# Altium footprint library TriggersLib.PcbLib: 262 footprints (part 2 of 17)
Each footprint in its own frame and in the unit in brackets; x right, y up, seen from the top. Pads: shape width x height; smd on the part's side, far side on the other; paste and mask are expansions set on the pad; w line width, h text height; cw(c..) or ccw(c..) is an arc to the next point about the centre after c.
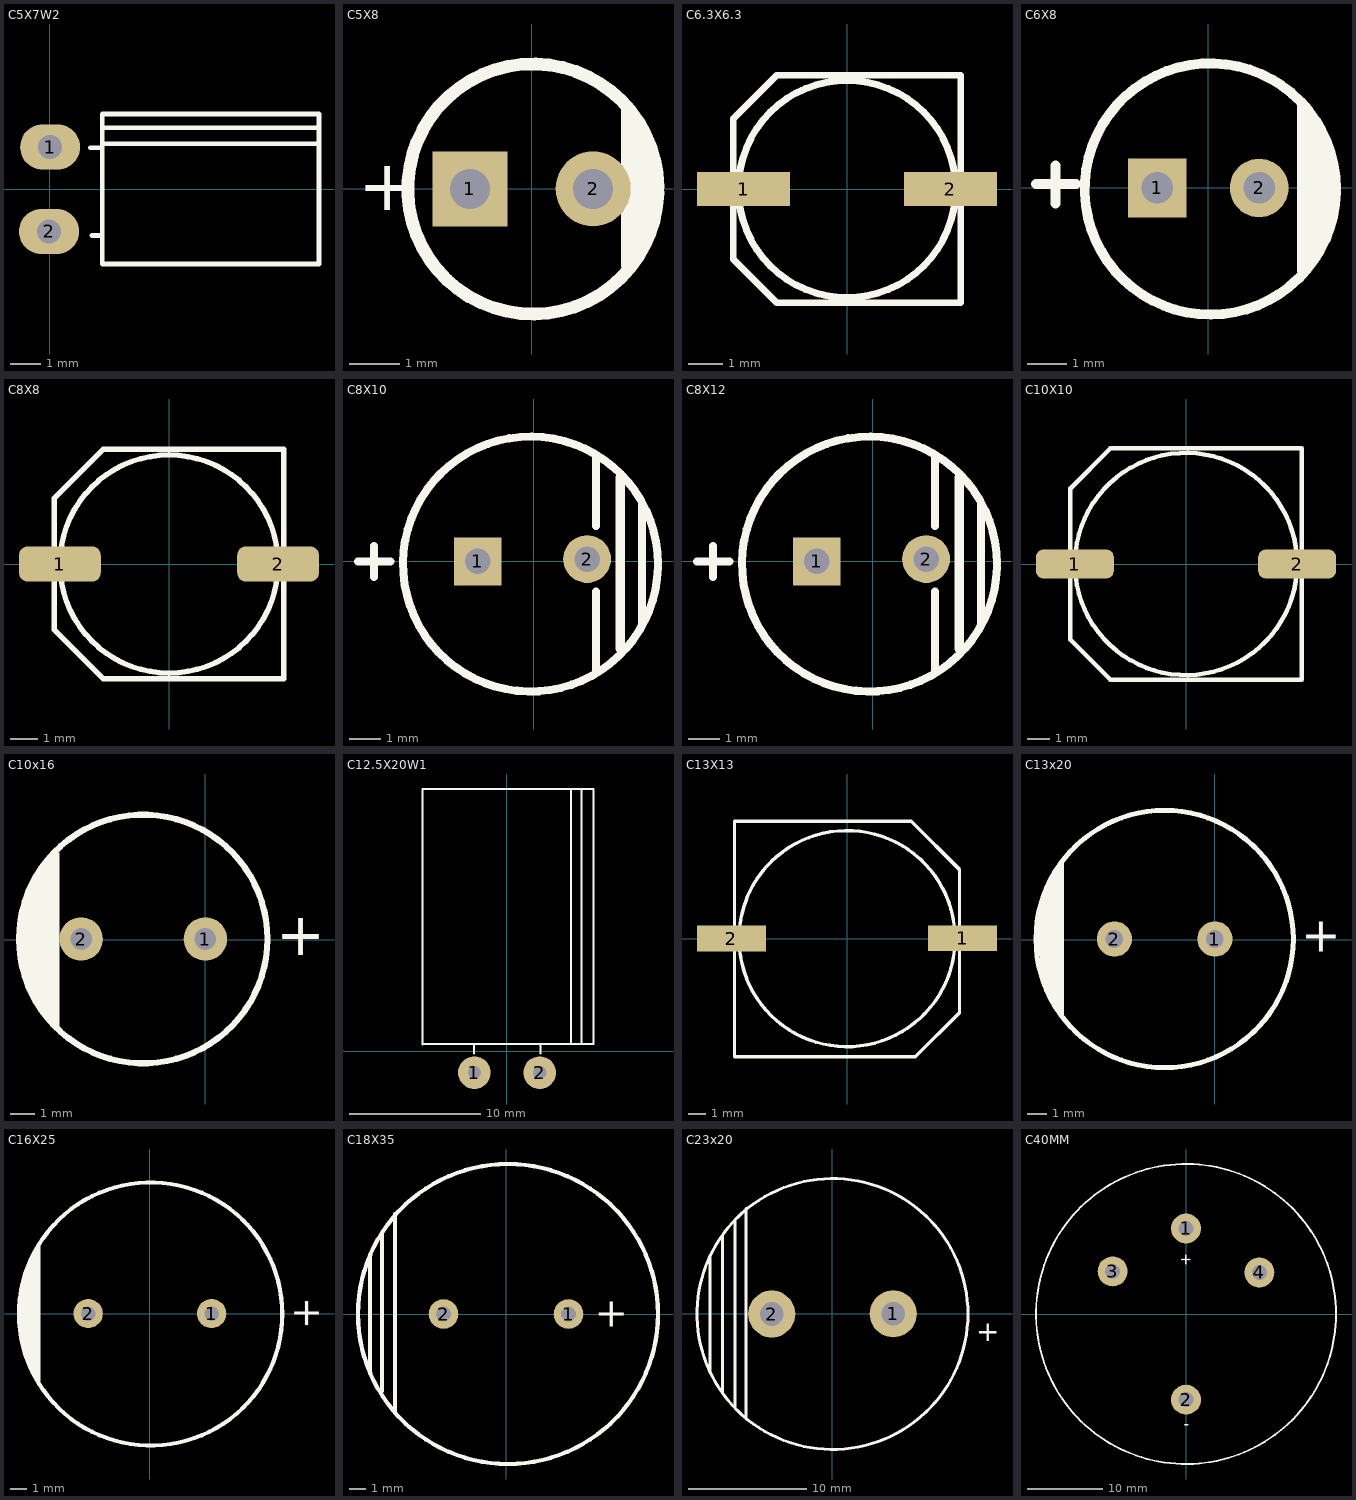
[diagram p1: the footprints below, top view; thin cyan lines are the x and y axes]

## C5X7W2 [mm]
pads (2):
  oval 2x1.5 hole 0.8: 1(0.018,1.404) 2(-0.018,-1.404)
Top Overlay:
  lines w0.152: 1.356,1.385 1.69,1.385 ; 1.406,-1.537 1.729,-1.537 ; 1.776,1.514 8.955,1.514 ; 1.83,2.048 8.955,2.048 ; 1.756,-2.483 8.956,-2.483 8.956,2.501 1.756,2.501 1.756,-2.483
3D body "User Library-Cap electro 5x7x2mm RA_.STEP": height 5.13, standoff 0.07, extent 1.652,-2.519 8.927,2.531
3D body "3HW1L1.STEP": height 2.7, standoff -1.5, extent -0.376,-1.785 2.305,-0.93
3D body "3HW1L1.STEP": height 2.7, standoff -1.5, extent -0.345,0.704 2.321,1.777

## C5X8 [mm] "RB.1/.2"
pads (2):
  rect 1.5x1.5 hole 0.8: 1(-1.231,0)
  round 1.5 hole 0.8: 2(1.231,0)
Top Overlay:
  lines w0.254: 2.526,-0.076 cw(c0.028,-0.004) 2.527,0.037
  lines w0.3: 1.942,-1.524 1.942,1.549
  lines w0.5: 2.196,-0.94 2.196,0.94
  text "+" at -3.468,-0.432 h1.02
3D body "C5x8.STEP": height 8.13, standoff -2.37, extent -2.499,-2.503 2.501,2.489

## C6.3X6.3 [mm]
height 5.5
pads (2):
  rect 2.7x1 smd: 1(-3,0) 2(3,0)
Top Overlay:
  circle w0.2: c0,0 r3.15
  lines w0.2: -3.3,2.032 -3.3,-2.032 -2.032,-3.3 3.3,-3.3 3.3,3.3 -2.032,3.3 -3.287,2.045
3D body "SL-E.step": height 5.2, standoff 0, extent -3.5,-3.302 3.5,3.298

## C6X8 [mm]
pads (2):
  rect 1.5x1.5 hole 0.8: 1(-1.3,0)
  round 1.5 hole 0.8: 2(1.3,0)
Top Overlay:
  lines w0.254: -4.4,0.1 -3.384,0.1 ; -3.9,-0.4 -3.9,0.567 ; 2.388,-2.108 2.388,2.159 ; 3.261,-0.116 cw(c0.052,-0.028) 3.262,-0.025
  lines w0.3: 2.642,-1.88 2.642,1.778
  lines w0.5: 2.896,-1.245 2.896,1.168
3D body "6_3x7x2_5mm.STEP": height 7.53, standoff -3.01, extent -3.15,-3.201 3.201,3.15

## C8X8 [mm]
height 10
pads (2):
  rrect50% 3x1.3 smd: 1(-4,0) 2(4,0)
Top Overlay:
  circle w0.2: c0,0 r4
  lines w0.2: -4.2,-2.413 -4.2,2.413 -2.413,4.2 4.2,4.2 4.2,-4.2 -2.413,-4.2 -4.2,-2.413
3D body "SL-H.step": height 10.5, standoff 0, extent -4.521,-4.216 4.479,4.084

## C8X10 [mm]
pads (2):
  rect 1.5x1.5 hole 0.8: 1(-1.753,-0.013)
  round 1.5 hole 0.8: 2(1.676,0.064)
Top Overlay:
  lines w0.254: -5.512,-0.013 -4.496,-0.013 ; -5.004,-0.495 -5.004,0.472 ; 1.956,-3.467 1.956,-0.953 ; 1.956,1.105 1.956,3.238 ; 3.404,-1.994 3.404,1.816 ; 3.898,-0.201 cw(c-0.1,-0.091) 3.9,-0.088
  lines w0.3: 2.718,-2.756 2.718,2.629
3D body "CAP 8X11_5.STEP": height 11.74, standoff -18.75, extent -4.102,-4 3.898,4

## C8X12 [mm]
pads (2):
  rect 1.5x1.5 hole 0.8: 1(-1.753,-0.013)
  round 1.5 hole 0.8: 2(1.676,0.064)
Top Overlay:
  lines w0.254: -5.512,-0.013 -4.496,-0.013 ; -5.004,-0.495 -5.004,0.472 ; 1.956,-3.467 1.956,-0.953 ; 1.956,1.105 1.956,3.238 ; 3.404,-1.994 3.404,1.816 ; 3.898,-0.201 cw(c-0.1,-0.091) 3.9,-0.088
  lines w0.3: 2.718,-2.756 2.718,2.629
3D body "CAP 8X11_5.STEP": height 11.74, standoff -18.75, extent -4.102,-4 3.898,4

## C10X10 [mm]
height 10
pads (2):
  rrect50% 3.5x1.3 smd: 1(-5,0) 2(5,0)
Top Overlay:
  circle w0.2: c0,0 r5
  lines w0.2: -5.2,3.404 -5.2,-3.404 -3.404,-5.2 5.2,-5.2 5.2,5.2 -3.404,5.2 -5.191,3.413
3D body "SW3dPS-capacitor size G.STEP": height 10.21, standoff -0.01, extent -5.775,-5.118 5.825,5.182

## C10x16 [mil] "RB.2/.4"
pads (2):
  round 70 hole 35: 1(0,1) 2(-200,1)
Top Overlay:
  circle w10: c-100,1 r200
  rectangle: -295,-60 -265,55
  rectangle: -285,-80 -260,90
  rectangle: -270,-110 -245,115
  rectangle: -250,-140 -235,140
  lines w11.81: -245,130 ccw(c-105.35,2.7) -241.45,-128.39
  text "+" at 114,-25 h68.9
3D body "Cap 10x16.STEP": height 708.66, standoff -669.29, extent -296.85,-197.7 96.85,196

## C12.5X20W1 [mm]
pads (2):
  round 2.5 hole 1: 1(-2.49,-1.63) 2(2.508,-1.631)
Top Overlay:
  lines w0.152: -6.474,0.546 6.593,0.546 6.635,0.588 6.635,20.079 -6.471,20.079 -6.471,0.521 ; -2.527,-0.164 -2.527,0.519 ; 2.577,-0.175 2.577,0.514 ; 4.891,0.566 4.891,20.004 ; 5.724,0.575 5.724,20.074
3D body "User Library-Cap electro 12_5x20x5_0mm RA_.STEP": height 13.07, standoff -2.14, extent -6.474,-1.939 6.577,20.05

## C13X13 [mm]
pads (2):
  rect 4x1.5 smd: 1(6.706,0.025) 2(-6.706,0)
Top Overlay:
  circle w0.2: c0,0 r6.271
  lines w0.2: -6.528,-6.85 -6.528,6.807 3.734,6.807 6.528,4.013 6.528,-4.293 3.971,-6.85 -6.528,-6.85
3D body "CAP_13x14.step": height 13.8, standoff -0.2, extent -7.5,-6.85 7.501,6.85

## C13x20 [mil] "RB.2/.5"
pads (2):
  round 70 hole 35: 1(0,1) 2(-200,1)
Top Overlay:
  circle w10: c-100,1 r255.91
  rectangle: -312,-149 -300,152
  rectangle: -323,-132 -309,135
  rectangle: -332,-114 -314,121
  lines w10: -349,-29 -349,45 ; -343,-68 -343,72 ; -336,-97 -336,96
  text "+" at 172,-24 h68.9
3D body "Cap 12.5x20.STEP": height 786.92, standoff -748.03, extent -348.13,-245.13 144,247

## C16X25 [mil]
pads (2):
  round 70 hole 35: 1(147.64,0) 2(-147.64,0)
Top Overlay:
  circle w10: c1.64,-1 r314.96
  rectangle: -274.36,-161 -262.36,161
  rectangle: -285.36,-143 -270.36,140
  rectangle: -294.36,-117 -276.36,118
  lines w10: -311.36,-27 -311.36,35 ; -305.36,-66 -305.36,69 ; -298.36,-95 -298.36,93
  text "+" at 335.64,-28 h68.9
3D body "Cap16x25.STEP": height 984.25, standoff -748.03, extent -312.96,-317 316.96,312.92

## C18X35 [mil]
height 35.43
pads (2):
  round 70 hole 35: 1(147.64,0) 2(-147.64,0)
Top Overlay:
  circle w10: c4.67,0 r354.33
  lines w10: -321,-137 -321,137 ; -293,-182 -293,190 ; -262,-231 -262,236
  text "+" at 210,-30 h68.9
3D body "C18X35.STEP": height 1476.38, standoff -118.11, extent -358.05,-360.23 368.05,365

## C23x20 [mm] "RB.2/.5"
pads (2):
  round 4 hole 2: 1(5.156,0) 2(-5.156,-0.013)
Top Overlay:
  circle w0.254: c0,-0.013 r11.5
  lines w0.254: -10.389,-4.928 -10.389,4.928 ; -9.322,-6.756 -9.322,6.706 ; -8.255,-7.95 -8.255,8.001 ; -7.341,-8.915 -7.341,8.941
  text "+" at 12.217,-2.311 h1.75
3D body "C22X25.step": height 25, standoff 0, extent -10.899,-11.026 11.101,10.975

## C40MM [mm]
pads (4):
  round 4 hole 2: 1(0,11.417) 2(0,-11.417) 3(-9.779,5.702) 4(9.779,5.55)
Top Overlay:
  circle w0.254: c0,0.013 r20
  text "+" at -0.635,8.128 h1.52
  text "-" at -0.279,-15.342 h1.52
3D body "1000uF-450V .step": height 80, standoff -9.9, extent -19.975,-20.038 20.025,19.913